# Altium footprint library 总库.PcbLib: 264 footprints (part 4 of 17)
Each footprint in its own frame and in the unit in brackets; x right, y up, seen from the top. Pads: shape width x height; smd on the part's side, far side on the other; paste and mask are expansions set on the pad; w line width, h text height; cw(c..) or ccw(c..) is an arc to the next point about the centre after c.
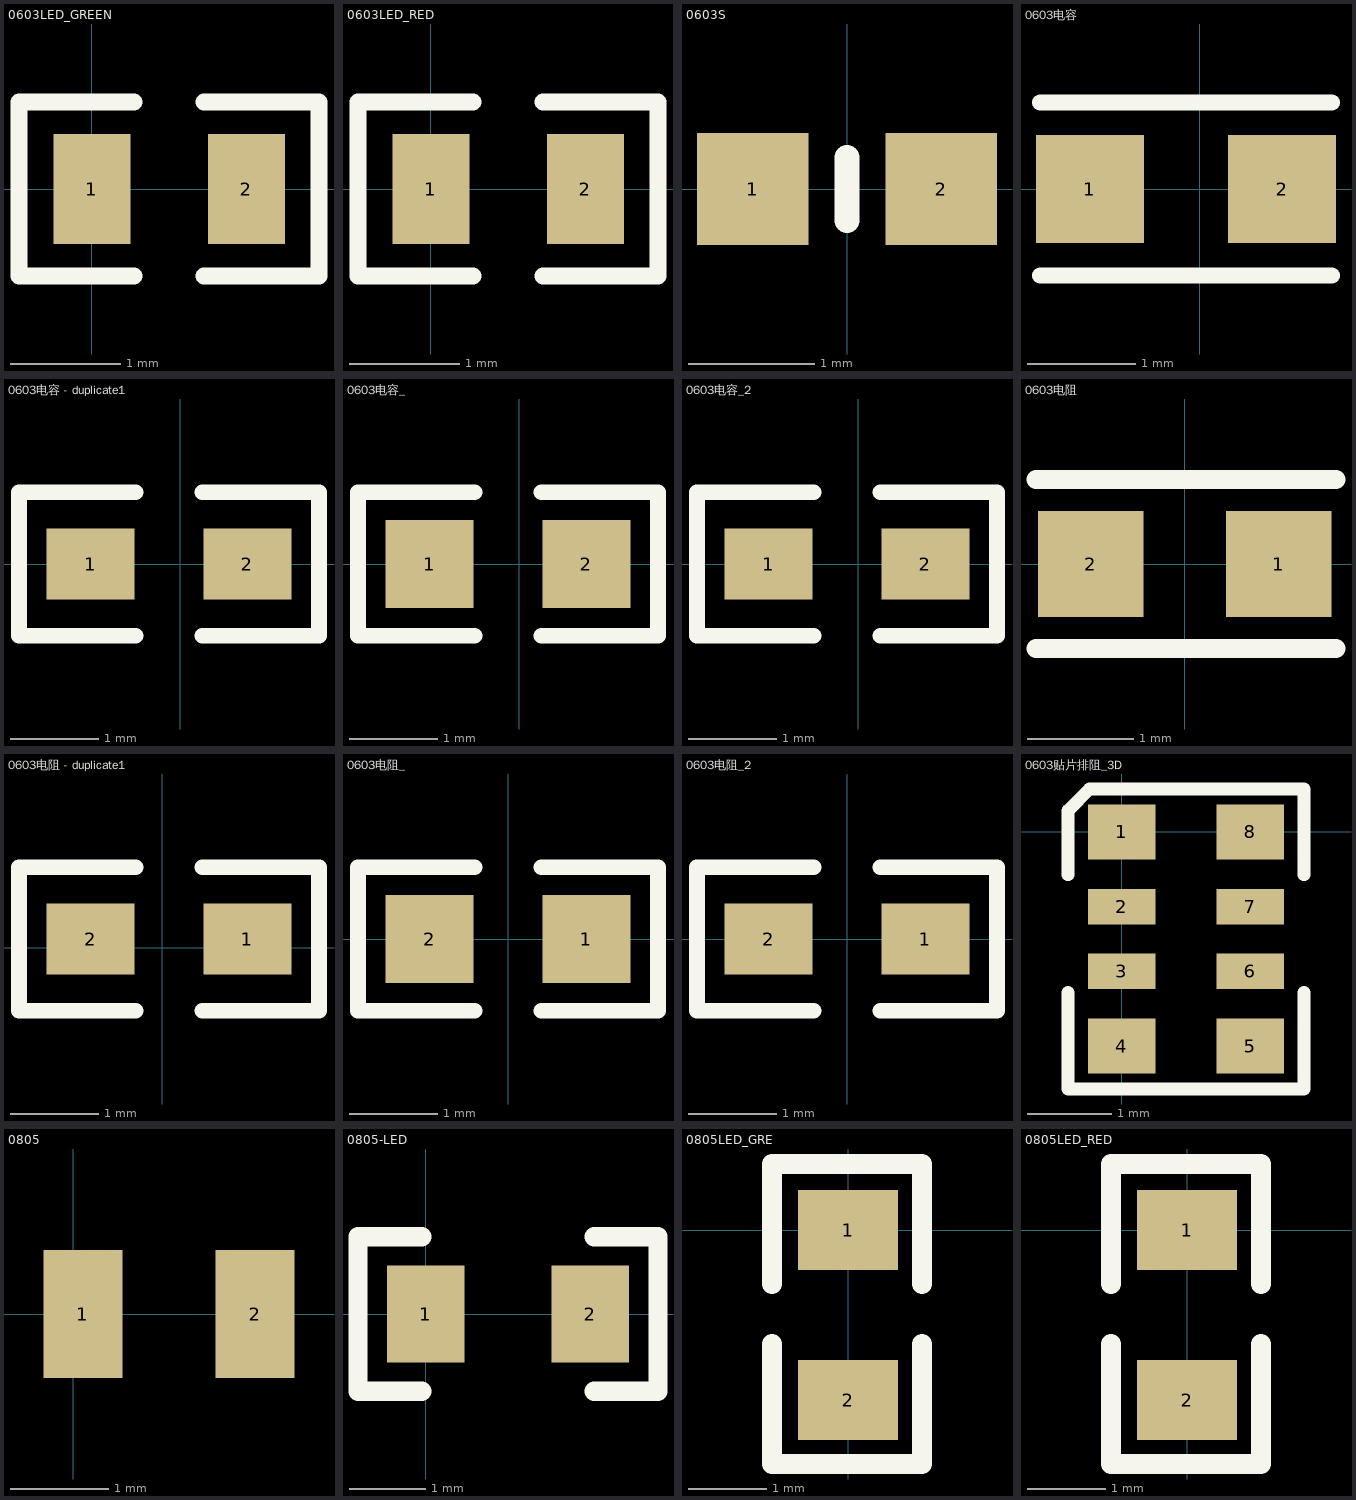
[diagram p3: the footprints below, top view; thin cyan lines are the x and y axes]

## 0603LED_GREEN [mm]
pads (2):
  rect 0.7x1 smd: 1(0,0) 2(1.4,0)
Top Overlay:
  lines w0.152: 0.381,-0.787 -0.66,-0.787 -0.66,0.787 0.381,0.787 ; 1.016,-0.787 2.057,-0.787 2.057,0.787 1.016,0.787
3D body: height -0.38, standoff -1.28, extent -0.139,-0.432 1.561,0.468

## 0603LED_RED [mm]
pads (2):
  rect 0.7x1 smd: 1(0,0) 2(1.4,0)
Top Overlay:
  lines w0.152: 0.381,-0.787 -0.66,-0.787 -0.66,0.787 0.381,0.787 ; 1.016,-0.787 2.057,-0.787 2.057,0.787 1.016,0.787
3D body: height -0.38, standoff -1.28, extent -0.139,-0.432 1.561,0.468

## 0603S [mil]
pads (2):
  rect 35x35 smd: 1(-29.5,0) 2(29.5,0)
Top Overlay:
  lines w7.87: 0,-9.84 0,9.84
3D body: height 20, standoff 0, extent -29.53,-17.72 31.5,17.72

## 0603电容 [mm]
pads (2):
  rect 1x1 smd: 1(-1.016,0) 2(0.762,0)
Top Overlay:
  lines w0.15: -1.477,-0.8 1.223,-0.8 ; -1.477,0.8 1.223,0.8
3D body: height 0.3, standoff 0, extent -0.916,-0.381 0.684,0.419

## 0603电容 - duplicate1 [mm]
pads (2):
  rect 1x0.8 smd: 1(-1.016,0) 2(0.762,0)
Top Overlay:
  lines w0.178: -0.508,-0.813 -1.829,-0.813 -1.829,0.813 -0.508,0.813 ; 0.254,-0.813 1.575,-0.813 1.575,0.813 0.254,0.813
3D body: height 0.3, standoff 0, extent -0.916,-0.381 0.684,0.419

## 0603电容_ [mm]
pads (2):
  rect 1x1 smd: 1(-1.016,0) 2(0.762,0)
Top Overlay:
  lines w0.178: -0.508,-0.813 -1.829,-0.813 -1.829,0.813 -0.508,0.813 ; 0.254,-0.813 1.575,-0.813 1.575,0.813 0.254,0.813
3D body: height 0.3, standoff 0, extent -0.916,-0.381 0.684,0.419

## 0603电容_2 [mm]
pads (2):
  rect 1x0.8 smd: 1(-1.016,0) 2(0.762,0)
Top Overlay:
  lines w0.178: -0.508,-0.813 -1.829,-0.813 -1.829,0.813 -0.508,0.813 ; 0.254,-0.813 1.575,-0.813 1.575,0.813 0.254,0.813
3D body: height 0.3, standoff 0, extent -0.916,-0.381 0.684,0.419

## 0603电阻 [mm]
pads (2):
  rect 1x1 smd: 1(0.889,0) 2(-0.889,0)
Top Overlay:
  lines w0.178: -1.406,-0.8 1.431,-0.8 ; -1.406,0.8 1.431,0.8
3D body: height 0.3, standoff 0, extent -0.8,-0.4 0.8,0.4

## 0603电阻 - duplicate1 [mm]
pads (2):
  rect 1x0.8 smd: 1(0.965,0.102) 2(-0.813,0.102)
Top Overlay:
  lines w0.178: -0.305,-0.711 -1.626,-0.711 -1.626,0.914 -0.305,0.914 ; 0.457,-0.711 1.778,-0.711 1.778,0.914 0.457,0.914
3D body: height 0.3, standoff 0, extent -0.724,-0.298 0.876,0.502

## 0603电阻_ [mm]
pads (2):
  rect 1x1 smd: 1(0.889,0) 2(-0.889,0)
Top Overlay:
  lines w0.178: -0.381,-0.813 -1.702,-0.813 -1.702,0.813 -0.381,0.813 ; 0.381,-0.813 1.702,-0.813 1.702,0.813 0.381,0.813
3D body: height 0.3, standoff 0, extent -0.8,-0.4 0.8,0.4

## 0603电阻_2 [mm]
pads (2):
  rect 1x0.8 smd: 1(0.889,0) 2(-0.889,0)
Top Overlay:
  lines w0.178: -0.381,-0.813 -1.702,-0.813 -1.702,0.813 -0.381,0.813 ; 0.381,-0.813 1.702,-0.813 1.702,0.813 0.381,0.813
3D body: height 0.3, standoff 0, extent -0.8,-0.4 0.8,0.4

## 0603贴片排阻_3D [mm]
pads (8):
  rect 0.8x0.65 smd: 1(0,0) 4(0,-2.54) 5(1.524,-2.54) 8(1.524,0)
  rect 0.8x0.42 smd: 2(0,-0.889) 3(0,-1.651) 6(1.524,-1.651) 7(1.524,-0.889)
Top Overlay:
  lines w0.152: -0.635,-1.905 -0.635,-3.048 2.159,-3.048 2.159,-1.905 ; -0.635,-0.508 -0.635,0.254 -0.381,0.508 2.159,0.508 2.159,-0.508
3D body: height 0.51, standoff -0.01, extent -0.025,-2.845 1.575,0.355

## 0805 [mm]
pads (2):
  rect 0.8x1.3 smd: 1(0.1,0) 2(1.85,0)
3D body: height 1.15, standoff 0, extent -0.1,-0.65 2.05,0.65

## 0805-LED [mil]
pads (2):
  rect 40x50 smd: 1(0,0) 2(85,0)
Top Overlay:
  lines w10: -2,-40 -35,-40 -35,40 -2,40 ; 87,-40 120,-40 120,40 87,40
3D body: height 30, standoff 0, extent 66,-25 82,25
3D body: height 30, standoff 0, extent 2,-25 18,25
3D body: height 31.5, standoff 0, extent 18,-25 66,25

## 0805LED_GRE [mil]
pads (2):
  rect 50x40 smd: 1(0,0) 2(0,-85)
Top Overlay:
  lines w10: -38,-57 -38,-117 37,-117 37,-57 ; -38,-27 -38,33 37,33 37,-27
3D body: height 43.31, standoff 0, extent -24.21,-84.76 25,-5.24

## 0805LED_RED [mil]
pads (2):
  rect 50x40 smd: 1(0,0) 2(0,-85)
Top Overlay:
  lines w10: -38,-57 -38,-117 37,-117 37,-57 ; -38,-27 -38,33 37,33 37,-27
3D body: height 43.31, standoff 0, extent -24.21,-84.76 25,-5.24